# Altium footprint library Inductor.PcbLib: 39 footprints (part 3 of 3)
Each footprint in its own frame and in the unit in brackets; x right, y up, seen from the top. Pads: shape width x height; smd on the part's side, far side on the other; paste and mask are expansions set on the pad; w line width, h text height; cw(c..) or ccw(c..) is an arc to the next point about the centre after c.
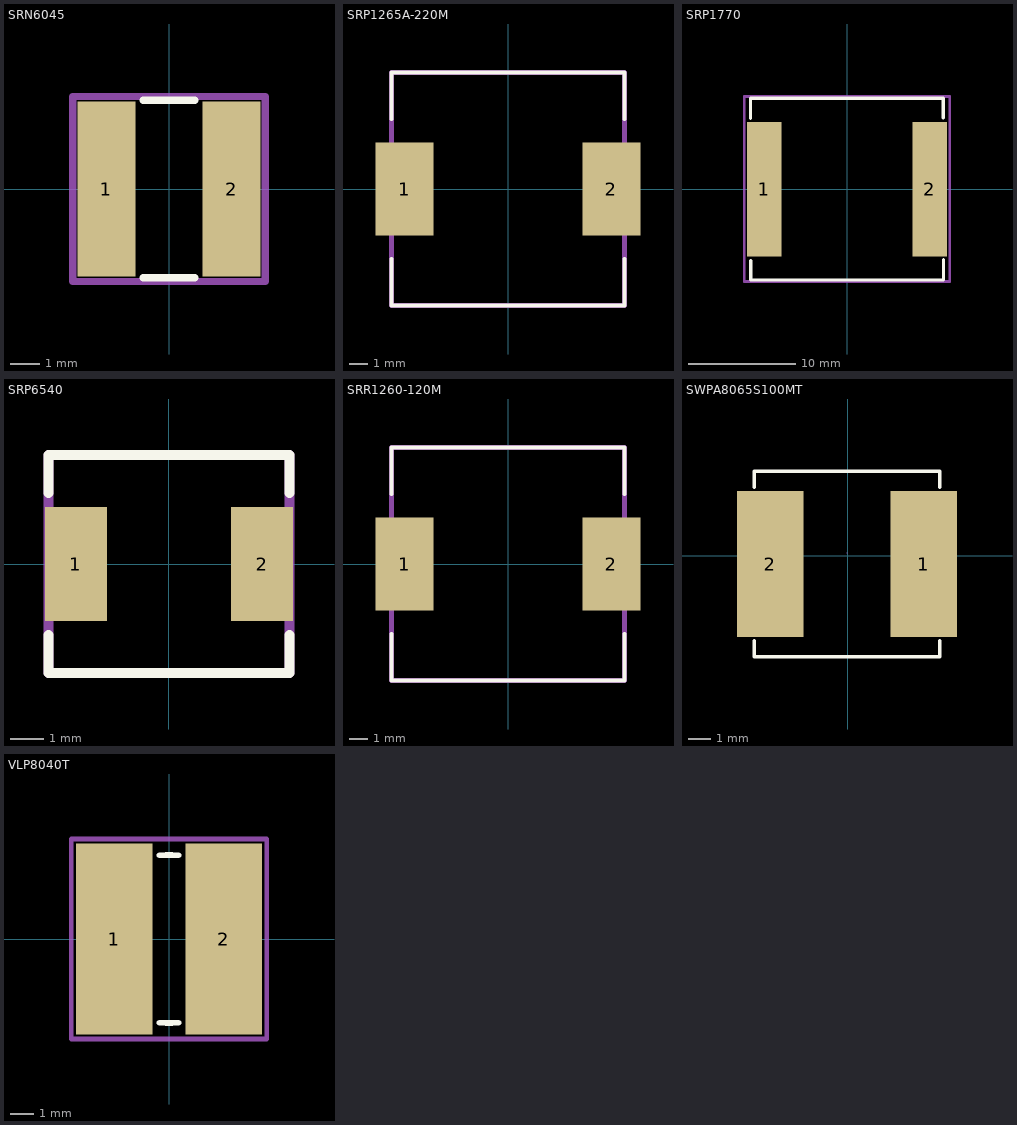
[diagram p2: the footprints below, top view; thin cyan lines are the x and y axes]

## SRN6045 [mm]
pads (2):
  rect 2x6 smd: 1(-2.15,0) 2(2.15,0)
Top Overlay:
  lines w0.254: -0.889,-3.048 0.889,-3.048 ; -0.889,3.048 0.889,3.048
Mechanical 13:
  lines w0.254: -3.302,-3.175 -3.302,3.175 3.302,3.175 3.302,-3.175 -3.302,-3.175
  text ".Designator" at -2.921,-0.635 h1.5
Mechanical 15:
  lines w0.254: -3.302,-3.175 3.302,-3.175 3.302,3.175 -3.302,3.175 -3.302,-3.175
  text ".Comment" at -2.921,-0.635 h1.5
3D body "srn6045.stp": height 4.5, standoff 0, extent -3,-3 3,3

## SRP1265A-220M [mm] "FIXED IND 22UH 9A 37 MOHM SMD"
pads (2):
  rect 3.1x5 smd: 1(-5.55,0) 2(5.55,0)
Top Overlay:
  lines w0.2: -6.25,-3.75 -6.25,-6.25 6.25,-6.25 6.25,-3.75 ; -6.25,3.75 -6.25,6.25 6.25,6.25 6.25,3.75
Mechanical 13:
  lines w0.254: -6.25,-6.25 -6.25,6.25 6.25,6.25 6.25,-6.25 -6.25,-6.25
  text ".Designator" at -2.921,-0.635 h1.5
Mechanical 15:
  lines w0.254: -6.25,-6.25 6.25,-6.25 6.25,6.25 -6.25,6.25 -6.25,-6.25
  text ".Comment" at -2.921,-0.635 h1.5
3D body "SRP1265A series.stp": height 6.31, standoff 0, extent -6.45,-6.25 6.45,6.25

## SRP1770 [mm]
pads (2):
  rect 3.2x12.5 smd: 1(-7.7,0) 2(7.7,0)
Top Overlay:
  lines w0.3: -8.975,6.575 -8.975,8.45 8.95,8.45 8.95,6.625 ; -8.95,-6.625 -8.95,-8.45 8.975,-8.45 8.975,-6.575
Mechanical 13:
  lines w0.254: -9.55,-8.6 -9.55,8.625 9.55,8.625 9.55,-8.6 -9.55,-8.6
  text ".Designator" at -2.921,-0.635 h1.5
Mechanical 15:
  lines w0.254: -9.55,-8.6 9.55,-8.6 9.55,8.625 -9.55,8.625 -9.55,-8.6
  text ".Comment" at -2.921,-0.635 h1.5
3D body "SRP1770TA.stp": height 6.81, standoff 0, extent -8.95,-8.45 8.95,8.45

## SRP6540 [mm]
pads (2):
  rect 1.85x3.4 smd: 1(-2.775,0) 2(2.775,0)
Top Overlay:
  lines w0.3: -3.6,-2.125 -3.6,-3.25 3.6,-3.25 3.6,-2.125 ; -3.6,2.125 -3.6,3.25 3.6,3.25 3.6,2.125
Mechanical 13:
  lines w0.3: -3.6,-3.25 -3.6,-2.125 -3.6,3.25 3.6,3.25 3.6,2.125 3.6,-3.25 -3.6,-3.25
  text ".Designator" at -1.6,-0.3 h1.2
Mechanical 15:
  lines w0.3: -3.6,-3.25 3.6,-3.25 3.6,2.125 3.6,3.25 -3.6,3.25 -3.6,-2.125 -3.6,-3.25
  text ".Comment" at -1.45,-0.05 h1.2
3D body "SRP6540.stp": height 3.97, standoff -0.02, extent -3.594,-3.251 3.594,3.251

## SRR1260-120M [mm] "FIXED IND 12UH 5.2A 23 MOHM SMD"
pads (2):
  rect 3.1x5 smd: 1(-5.55,0) 2(5.55,0)
Top Overlay:
  lines w0.2: -6.25,-3.75 -6.25,-6.25 6.25,-6.25 6.25,-3.75 ; -6.25,3.75 -6.25,6.25 6.25,6.25 6.25,3.75
Mechanical 13:
  lines w0.254: -6.25,-6.25 6.25,-6.25 6.25,6.25 -6.25,6.25 -6.25,-6.25
  text ".Designator" at -2.921,-0.635 h1.5
Mechanical 15:
  lines w0.254: -6.25,-6.25 -6.25,6.25 6.25,6.25 6.25,-6.25 -6.25,-6.25
  text ".Comment" at -2.921,-0.635 h1.5
3D body "srr1260.stp": height 6, standoff 0, extent -6.25,-6.25 6.25,6.25

## SWPA8065S100MT [mm]
pads (2):
  rect 2.924x6.42 smd paste+0 mask+0.051: 1(3.342,-0.372) 2(-3.414,-0.372)
Top Overlay:
  lines w0.152: -4.112,-3.734 -4.112,-4.448 4.04,-4.448 4.04,-3.734 ; -4.112,2.991 -4.112,3.705 4.04,3.705 4.04,2.991
Mechanical 15:
  lines w0.003: -0.036,0.124 -0.036,0.124
3D body "ASPI-0630HI.STEP": height 3.05, standoff 0.05, extent -3.6,-3.675 3.6,2.975

## VLP8040T [mm]
pads (2):
  rect 3.3x8.2 smd: 1(-2.35,0) 2(2.35,0)
Top Overlay:
  lines w0.254: -0.4,-3.6 ccw(c0,0) 0.4,-3.6 ; -0.4,3.6 cw(c0,0) 0.4,3.6
Mechanical 13:
  lines w0.2: -4.2,-4.3 -4.2,4.3 4.2,4.3 4.2,-4.3 -4.2,-4.3
  text ".Designator" at -3.5,-0.3 h1.5
Mechanical 15:
  lines w0.2: -4.2,-4.3 4.2,-4.3 4.2,4.3 -4.2,4.3 -4.2,-4.3
  text ".Comment" at -3.4,-0.3 h1.5
3D body "User Library-VLP8040T-1.step": height 4.2, standoff 0, extent -3.75,-3.95 3.75,3.95